# Altium footprint library PCB_LIB.PcbLib: 116 footprints (part 8 of 8)
Each footprint in its own frame and in the unit in brackets; x right, y up, seen from the top. Pads: shape width x height; smd on the part's side, far side on the other; paste and mask are expansions set on the pad; w line width, h text height; cw(c..) or ccw(c..) is an arc to the next point about the centre after c.
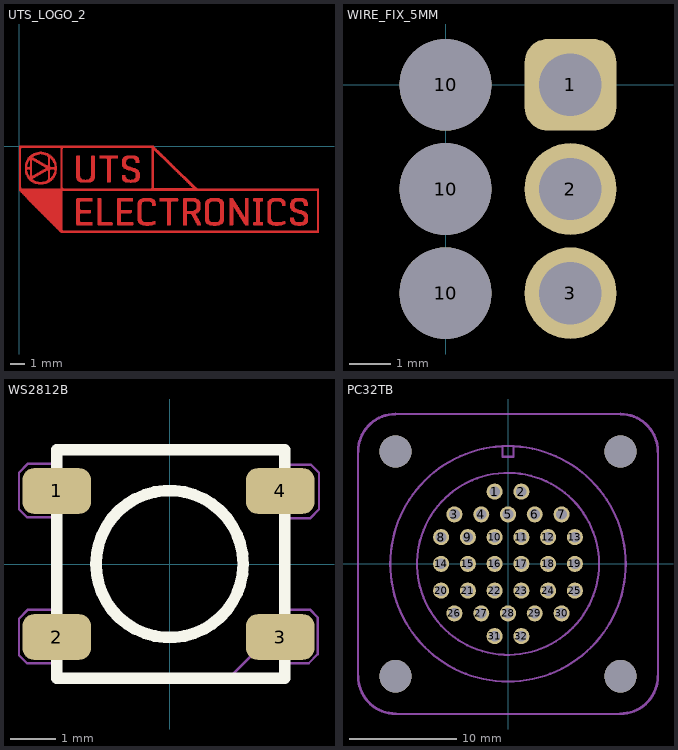
[diagram p7: the footprints below, top view; thin cyan lines are the x and y axes]

## UTS_LOGO_2 [mm] "Логотип УТС"
Top Layer:
  drawing of 2408 lines, arcs and shapes, not listed
Top Solder:
  drawing of 2409 lines, arcs and shapes, not listed

## WIRE_FIX_5MM [mm]
pads (6):
  rrect50% 2.2x2.2 hole 1.5: 1(3,0)
  round 2.2 hole 1.5: 2(3,-2.5) 3(3,-5)
  round 2.2 hole 2.2: 10(0,-5) 10(0,-2.5) 10(0,0)

## WS2812B [mm]
pads (4):
  rrect50% 1.5x1 smd: 1(-2.475,1.6) 2(-2.475,-1.6) 3(2.425,-1.6) 4(2.425,1.6)
Top Overlay:
  circle w0.254: c0,0 r1.612
  lines w0.254: -2.475,-2.5 -2.475,2.5 2.525,2.5 2.525,-2.5 -2.475,-2.5
Mechanical 14:
  circle w0.05: c0,0 r1.613
  lines w0.05: -2.475,-2.175 -3.125,-2.175 -3.3,-2 -3.3,-1.2 -3.1,-1 -2.475,-1 ; -2.475,-2 -2.75,-2 -2.75,-1.25 -2.475,-1.25 ; -2.475,1.025 -3.125,1.025 -3.3,1.2 -3.3,2 -3.1,2.2 -2.475,2.2 ; -2.475,1.25 -2.75,1.25 -2.75,2 -2.475,2 ; 1.312,-2.488 2.537,-1.263 ; 2.525,-2.175 3.05,-2.175 3.25,-1.975 3.25,-1.175 3.075,-1 2.525,-1 ; 2.525,-2 2.8,-2 2.8,-1.25 2.525,-1.25 ; 2.525,1 3.075,1 3.275,1.2 3.275,2 3.1,2.175 2.55,2.175 ; 2.525,1.25 2.8,1.25 2.8,2 2.525,2 ; -2.475,-2.5 2.525,-2.5 2.525,2.475 2.5,2.5 -2.475,2.5 -2.475,-2.5
3D body "User Library-ws2812B-1.step": height 1.6, standoff 0.03, extent -2.675,-2.5 2.725,2.5

## РС32ТВ [mm]
pads (32):
  round 1.5 hole 1: 1(-1.25,6.75) 2(1.25,6.75) 3(-5,4.625) 4(-2.5,4.625) 5(0,4.625) 6(2.5,4.625) 7(5,4.625) 8(-6.25,2.5) 9(-3.75,2.5) 10(-1.25,2.5) 11(1.25,2.5) 12(3.75,2.5) 13(6.25,2.5) 14(-6.25,0) 15(-3.75,0) 16(-1.25,0) 17(1.25,0) 18(3.75,0) 19(6.25,0) 20(-6.25,-2.5) 21(-3.75,-2.5) 22(-1.25,-2.5) 23(1.25,-2.5) 24(3.75,-2.5) 25(6.25,-2.5) 26(-5,-4.625) 27(-2.5,-4.625) 28(0,-4.625) 29(2.5,-4.625) 30(5,-4.625) 31(-1.25,-6.75) 32(1.25,-6.75)
via -10.5,-10.5 diameter 3 hole 3
via 10.5,-10.5 diameter 3 hole 3
via 10.5,10.5 diameter 3 hole 3
via -10.5,10.5 diameter 3 hole 3
Mechanical 13:
  circle w0.2: c0,0 r8.5
  circle w0.2: c0,0 r11
  lines w0.2: -14,-10.5 -14,10.5 ; -10.5,-14.025 10.5,-14.025 ; -10.5,14 10.5,14 ; -0.5,11 -0.5,10 0.5,10 0.5,11 ; 14,-10.5 14,10.5
  lines w0.254: -14,-10.5 ccw(c-10.5,-10.5) -10.5,-14 ; -14,10.5 cw(c-10.5,10.5) -10.5,14 ; 10.5,-14 ccw(c10.5,-10.5) 14,-10.5 ; 10.5,14 cw(c10.5,10.5) 14,10.5